# Altium footprint library THU VIEN V1.PcbLib: 400 footprints (part 16 of 25)
Each footprint in its own frame and in the unit in brackets; x right, y up, seen from the top. Pads: shape width x height; smd on the part's side, far side on the other; paste and mask are expansions set on the pad; w line width, h text height; cw(c..) or ccw(c..) is an arc to the next point about the centre after c.
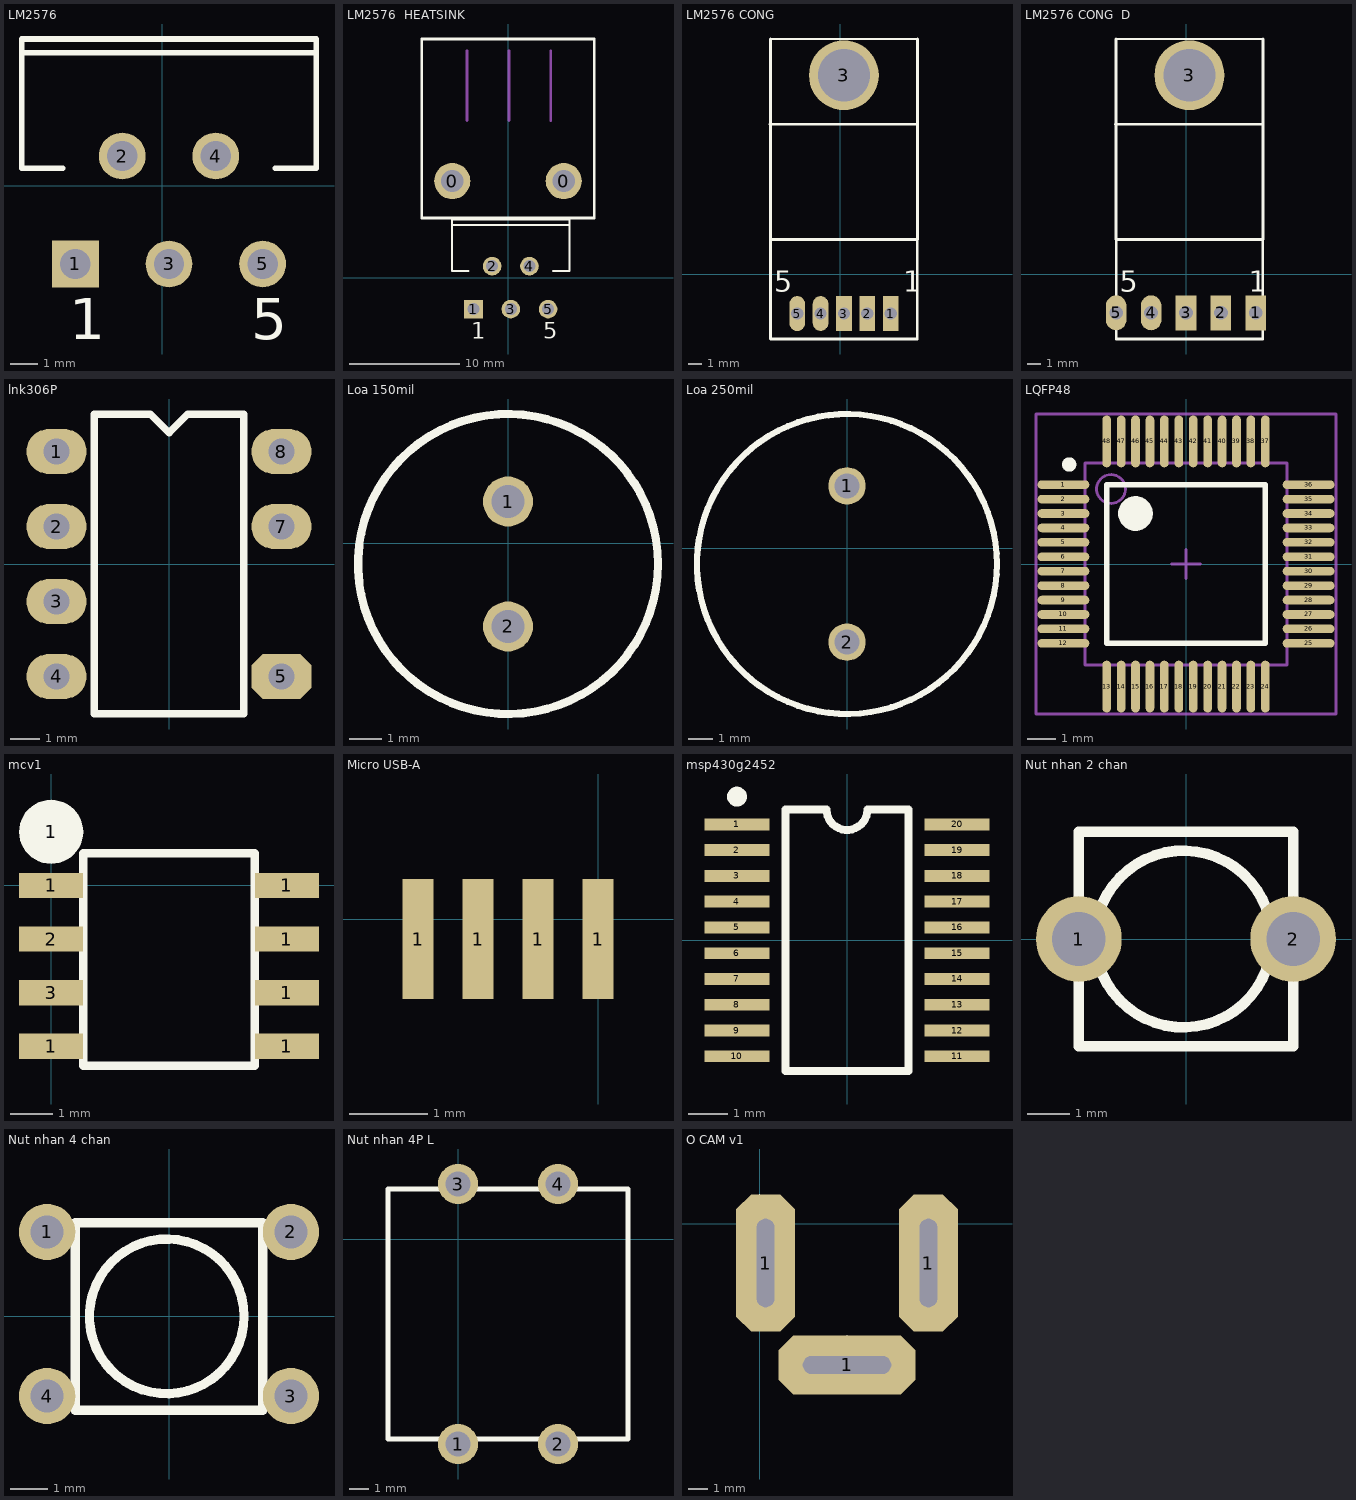
[diagram p15: the footprints below, top view; thin cyan lines are the x and y axes]

## LM2576 [mm]
pads (5):
  rect 1.7x1.7 hole 1.1: 1(-3.146,-2.849)
  round 1.7 hole 1.1: 2(-1.446,1.071) 3(0.254,-2.849) 4(1.954,1.071) 5(3.654,-2.849)
Top Overlay:
  lines w0.2: -5.096,4.821 5.604,4.821 ; -3.6,0.621 -5.096,0.621 -5.096,5.321 5.604,5.321 5.604,0.621 4.108,0.621
  text "1" at -3.366,-5.574 h1.5
  text "5" at 3.234,-5.574 h1.5
3D body: height 21.59, standoff -2.4, extent -4.826,-3.048 5.334,5.192

## LM2576  HEATSINK [mm]
pads (7):
  round 3.302 hole 2.032: 0(-5.08,8.826) 0(5.08,8.826)
  rect 1.7x1.7 hole 1.1: 1(-3.146,-2.849)
  round 1.7 hole 1.1: 2(-1.446,1.071) 3(0.254,-2.849) 4(1.954,1.071) 5(3.654,-2.849)
Top Overlay:
  lines w0.2: -5.27,5.46 5.43,5.46 ; -5.096,4.821 5.604,4.821 ; -3.6,0.621 -5.096,0.621 -5.096,5.321 5.604,5.321 5.604,0.621 4.108,0.621
  lines w0.254: -7.874,5.46 -7.874,21.78 -7.54,21.78 7.874,21.78 7.874,5.46 -7.874,5.46
  text "1" at -3.366,-5.574 h1.5
  text "5" at 3.234,-5.574 h1.5
Mechanical 1:
  lines w0.254: -3.73,14.35 -3.73,20.7 ; 0.08,14.35 0.08,20.7 ; 3.89,14.35 3.89,20.7
3D body: height 21.59, standoff -2.4, extent -4.826,-3.048 5.334,5.192
3D body: height 5, standoff -5, extent 4.336,8.078 5.83,9.575
3D body: height 5, standoff -5, extent -5.824,8.078 -4.33,9.575
3D body: height 22.86, standoff 0.76, extent -7.62,5.27 7.62,21.78

## LM2576 CONG [mil]
pads (6):
  rect 45x100 hole 35: 1(143.86,-112.17) 2(77,-112) 3(10,-112.17)
  round 200 hole 150: 3(10,570)
  oval 45x100 hole 35: 4(-57,-112)
  oval 45x100 hole 35 paste+0: 5(-123.86,-112.17)
Top Overlay:
  lines w7: -200.63,674 220.63,674
  lines w7.87: -201.63,429.8 219.63,429.8 ; -200.63,674 -200.63,100 220,100 220,-185 -200,-185 -200,100 ; 161.73,100 220.63,100 220.63,674
  text "1" at 180,-50 h59.06
  text "5" at -190,-50 h59.06
3D body: height 218.39, standoff -194.78, extent -191.12,-121 208.96,673.01

## LM2576 CONG  D [mm]
pads (6):
  rect 1.5x2.54 hole 1: 1(5.08,-2.794) 2(2.54,-2.794) 3(0,-2.794)
  round 5.08 hole 3.81: 3(0.254,14.478)
  oval 1.5x2.54 hole 1: 4(-2.54,-2.794)
  oval 1.5x2.54 hole 1 paste+0: 5(-5.08,-2.794)
Top Overlay:
  lines w0.178: -5.096,17.12 5.604,17.12
  lines w0.2: -5.121,10.917 5.579,10.917 ; -5.096,17.12 -5.096,2.54 5.588,2.54 5.588,-4.699 -5.08,-4.699 -5.08,2.54 ; 4.108,2.54 5.604,2.54 5.604,17.12
  text "1" at 4.572,-1.27 h1.5
  text "5" at -4.826,-1.27 h1.5
3D body: height 5.55, standoff -4.95, extent -4.854,-3.073 5.308,17.094

## lnk306P [mil]
pads (7):
  oval 80x60 hole 35: 1(-150,150) 2(-150,50) 3(-150,-50) 4(-150,-150) 7(150,50) 8(150,150)
  oct 80x60 hole 35: 5(150,-150)
Top Overlay:
  lines w10: -100,-200 -100,200 -25,200 0,175 25,200 100,200 100,-200 -100,-200
3D body: height 200.39, standoff -137.8, extent -154.92,-209.95 154.93,219.97

## Loa 150mil [mil]
pads (2):
  round 60 hole 40: 1(0,50) 2(0,-100)
Top Overlay:
  circle w10: c0,-25 r180.07
3D body: height 177.17, standoff -177.17, extent -178.16,-201.16 176.17,153.17

## Loa 250mil [mil]
pads (2):
  round 60 hole 40: 1(0,100) 2(0,-150)
Top Overlay:
  circle w10: c0,-25 r240.05
3D body: height 216.54, standoff -216.54, extent -236.22,-261.21 236.22,211.23

## LQFP48 [mm] "Thin QFP, 48-Leads, Body 7x7mm, Pitch 0.5mm, IPC Medium Density"
height 1.6
pads (48):
  oval 1.8x0.3 smd: 1(-4.25,2.75) 2(-4.25,2.25) 3(-4.25,1.75) 4(-4.25,1.25) 5(-4.25,0.75) 6(-4.25,0.25) 7(-4.25,-0.25) 8(-4.25,-0.75) 9(-4.25,-1.25) 10(-4.25,-1.75) 11(-4.25,-2.25) 12(-4.25,-2.75) 25(4.25,-2.75) 26(4.25,-2.25) 27(4.25,-1.75) 28(4.25,-1.25) 29(4.25,-0.75) 30(4.25,-0.25) 31(4.25,0.25) 32(4.25,0.75) 33(4.25,1.25) 34(4.25,1.75) 35(4.25,2.25) 36(4.25,2.75)
  oval 0.3x1.8 smd: 13(-2.75,-4.25) 14(-2.25,-4.25) 15(-1.75,-4.25) 16(-1.25,-4.25) 17(-0.75,-4.25) 18(-0.25,-4.25) 19(0.25,-4.25) 20(0.75,-4.25) 21(1.25,-4.25) 22(1.75,-4.25) 23(2.25,-4.25) 24(2.75,-4.25) 37(2.75,4.25) 38(2.25,4.25) 39(1.75,4.25) 40(1.25,4.25) 41(0.75,4.25) 42(0.25,4.25) 43(-0.25,4.25) 44(-0.75,4.25) 45(-1.25,4.25) 46(-1.75,4.25) 47(-2.25,4.25) 48(-2.75,4.25)
Top Overlay:
  circle w0.6: c-1.75,1.75 r0.3
  circle w0.25: c-4.05,3.45 r0.125
  lines w0.2: -2.75,-2.75 2.75,-2.75 2.75,2.75 -2.75,2.75 -2.75,-2.75
Mechanical 13:
  circle w0.1: c-2.6,2.6 r0.5
  lines w0.1: -3.5,-3.5 3.5,-3.5 3.5,3.5 -3.5,3.5 -3.5,-3.5
Mechanical 15:
  lines w0.1: -0.5,0 0.5,0 ; 0,-0.5 0,0.5 ; -5.2,-5.2 5.2,-5.2 5.2,5.2 -5.2,5.2 -5.2,-5.2
3D body: height 1.5, standoff 0, extent -4.5,-4.5 4.5,4.5

## mcv1 [mm]
pads (9):
  rect 1.52x0.6 smd: 1(0,-3.81) 1(0,0) 1(5.588,-3.81) 1(5.588,-2.54) 1(5.588,-1.27) 1(5.588,0) 2(0,-1.27) 3(0,-2.54)
  round 1.524 on Top Overlay: 1(0,1.27)
Top Overlay:
  lines w0.2: 0.762,-4.278 0.762,0.762 4.826,0.762 4.826,-4.278 0.762,-4.278
3D body: height 1.75, standoff 0, extent -0.306,-4.4 5.706,0.6

## micro sd [mm]
3D body: height 2.05, standoff 0.07, extent -8.988,-8.779 7.112,8.271

## Micro USB-A [mil] "USB A connector, 4pin, For USB sing"
height 100
pads (4):
  rect 15.75x60 smd: 1(-90,-10) 1(-60,-10) 1(-30,-10) 1(0,-10)
3D body: height 105.12, standoff -10.63, extent -187.09,-24.33 127.09,189.45

## msp430g2452 [mm]
pads (20):
  rect 1.65x0.3 smd: 1(-2.775,2.925) 2(-2.775,2.275) 3(-2.775,1.625) 4(-2.775,0.975) 5(-2.775,0.325) 6(-2.775,-0.325) 7(-2.775,-0.975) 8(-2.775,-1.625) 9(-2.775,-2.275) 10(-2.775,-2.925) 11(2.775,-2.925) 12(2.775,-2.275) 13(2.775,-1.625) 14(2.775,-0.975) 15(2.775,-0.325) 16(2.775,0.325) 17(2.775,0.975) 18(2.775,1.625) 19(2.775,2.275) 20(2.775,2.925)
Top Overlay:
  circle w0.25: c-2.775,3.625 r0.125
  lines w0.2: -1.55,-3.3 -1.55,3.3 -0.517,3.3 ccw(c0,3.3) 0.517,3.3 1.55,3.3 1.55,-3.3 -1.55,-3.3
3D body: height -0.41, standoff -1.61, extent -3.275,-3.3 3.275,3.3

## Nut nhan 2 chan [mil]
pads (2):
  round 80 hole 50: 1(-100,0) 2(100,0)
Top Overlay:
  circle w10: c-2.46,0 r82.46
  lines w10: -100,-100 100,-100 100,100 -100,100 -100,-100
3D body: height 216.85, standoff -58.74, extent -137.84,-115.11 131.84,121.11

## Nut nhan 4 chan [mil]
pads (4):
  round 60 hole 35: 1(-130,90) 2(130,90) 3(130,-85) 4(-130,-85)
Top Overlay:
  circle w10: c-2.46,0 r82.46
  lines w10: -100,-100 -100,100 100,100 100,-100 -100,-100
3D body: height 216.85, standoff -58.74, extent -137.84,-115.11 131.84,121.11

## Nut nhan 4P L [mil]
pads (4):
  round 80 hole 50: 1(0,-410) 2(200,-410) 3(0,110) 4(200,110)
Top Overlay:
  lines w10: -140,-400 340,-400 340,100 -140,100 -140,-400
3D body: height 478.09, standoff -98.74, extent -140,-426.57 332.44,126.57

## O CAM v1 [mm]
pads (5):
  round 0.254 hole 0.127: 0(4.45,-7.2) 0(8.6,-2)
  oct 3x7 hole 0.9 slot 4.5 at 90 deg: 1(0.3,-2) 1(8.6,-2)
  oct 7x3 hole 0.9 slot 4.5 at 0 deg: 1(4.45,-7.2)
Top Overlay:
  lines w0.025: 0,0 0,1.5 ; 0.3,-4.5 0.3,0.2 ; 4.45,-7.675 4.45,-5.675 ; 4.45,-7.2 6.45,-7.2
  lines w0.051: 0,-4 0,0 ; 0,-4 0.6,-4 ; 0,-4 0,0 ; 0,-4 0.6,-4 ; 0,0 0.6,0 ; 0,0 0.6,0 ; 0.6,-4 0.6,0 ; 0.6,-4 0.6,0 ; 2.45,-7.5 6.45,-7.5 ; 2.45,-7.5 2.45,-6.9 ; 2.45,-7.5 6.45,-7.5 ; 2.45,-7.5 2.45,-6.9 ; 2.45,-7.5 6.45,-7.5 ; 2.45,-6.9 6.45,-6.9 ; 2.45,-6.9 6.45,-6.9 ; 6.45,-7.5 6.45,-6.9 ; 6.45,-7.5 6.45,-6.9 ; 8.3,-4 8.3,0 ; 8.3,-4 8.9,-4 ; 8.3,-4 8.3,0 ; 8.3,-4 8.9,-4 ; 8.3,0 8.9,0 ; 8.3,0 8.9,0 ; 8.9,-4 8.9,0 ; 8.9,-4 8.9,0
3D body: height 15.59, standoff -2.5, extent -0.047,-7.5 8.897,0.972